# Altium footprint library SG__PCB_HOLE_Connector.PcbLib: 154 footprints (part 5 of 10)
Each footprint in its own frame and in the unit in brackets; x right, y up, seen from the top. Pads: shape width x height; smd on the part's side, far side on the other; paste and mask are expansions set on the pad; w line width, h text height; cw(c..) or ccw(c..) is an arc to the next point about the centre after c.
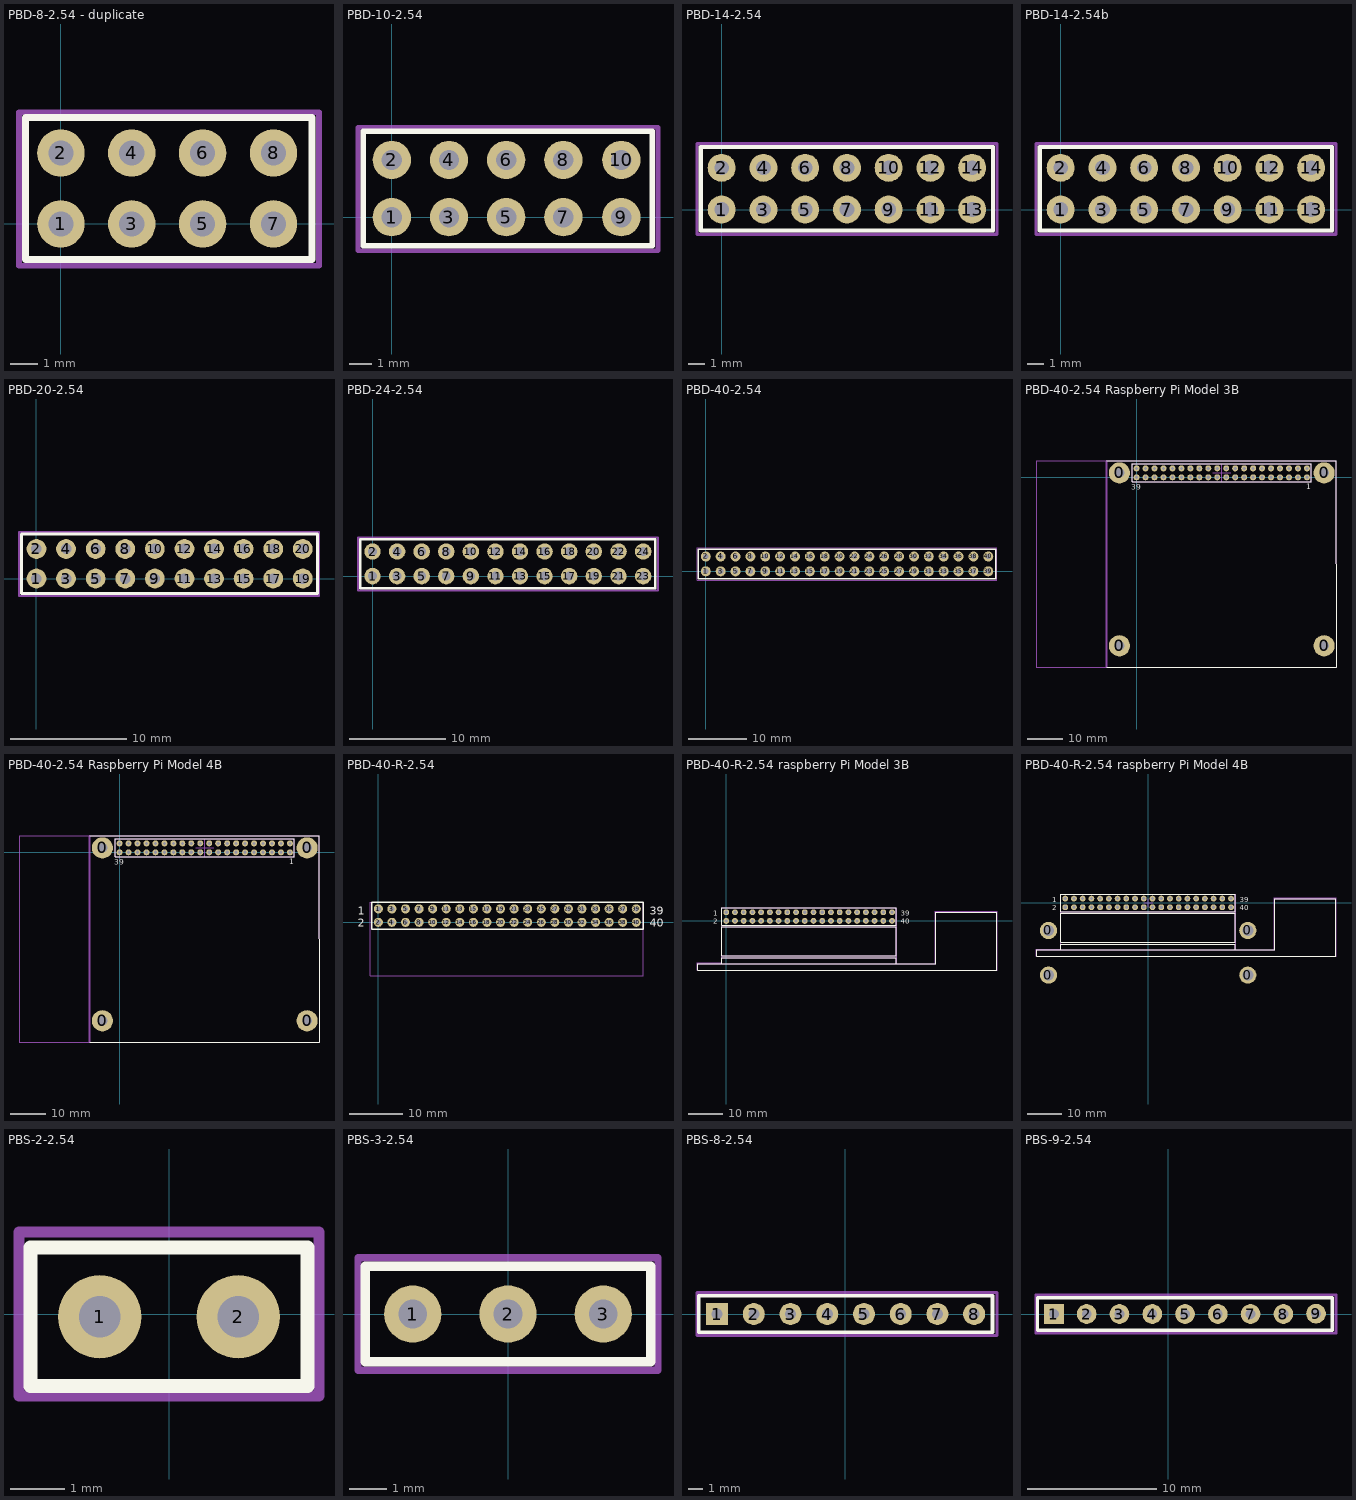
[diagram p4: the footprints below, top view; thin cyan lines are the x and y axes]

## PBD-8-2.54 - duplicate [mm]
pads (8):
  round 1.7 hole 0.9: 1(0,0) 2(0,2.54) 3(2.54,0) 4(2.54,2.54) 5(5.08,0) 6(5.08,2.54) 7(7.62,0) 8(7.62,2.54)
Top Overlay:
  lines w0.254: -1.27,-1.27 -1.27,3.81 9,3.81 9,-1.27 -1.27,-1.27
Top Courtyard:
  lines w0.2: -1.5,-1.5 -1.5,4 9.25,4 9.25,-1.5 -1.5,-1.5
3D body "PBS1-2.54.stp": height 9, standoff -2.65, extent 3.81,1.27 6.35,3.81
3D body "PBS1-2.54.stp": height 9, standoff -2.65, extent 3.81,-1.27 6.35,1.27
3D body "PBS1-2.54.stp": height 9, standoff -2.65, extent 6.35,-1.27 8.89,1.27
3D body "PBS1-2.54.stp": height 9, standoff -2.65, extent 6.35,1.27 8.89,3.81
3D body "PBS1-2.54.stp": height 9, standoff -2.65, extent 1.27,1.27 3.81,3.81
3D body "PBS1-2.54.stp": height 9, standoff -2.65, extent 1.27,-1.27 3.81,1.27
3D body "PBS1-2.54.stp": height 9, standoff -2.65, extent -1.27,-1.27 1.27,1.27
3D body "PBS1-2.54.stp": height 9, standoff -2.65, extent -1.27,1.27 1.27,3.81

## PBD-10-2.54 [mm]
pads (10):
  round 1.7 hole 0.9: 1(0,0) 2(0,2.54) 3(2.54,0) 4(2.54,2.54) 5(5.08,0) 6(5.08,2.54) 7(7.62,0) 8(7.62,2.54) 9(10.192,0) 10(10.192,2.54)
Top Overlay:
  lines w0.254: -1.27,-1.27 11.572,-1.27 11.572,3.81 -1.27,3.81 -1.27,-1.27
Top Courtyard:
  lines w0.2: -1.5,-1.5 11.822,-1.5 11.822,4 -1.5,4 -1.5,-1.5
3D body "PBS1-2.54.stp": height 9, standoff -2.65, extent 8.922,1.27 11.462,3.81
3D body "PBS1-2.54.stp": height 9, standoff -2.65, extent 8.922,-1.27 11.462,1.27
3D body "PBS1-2.54.stp": height 9, standoff -2.65, extent -1.27,1.27 1.27,3.81
3D body "PBS1-2.54.stp": height 9, standoff -2.65, extent -1.27,-1.27 1.27,1.27
3D body "PBS1-2.54.stp": height 9, standoff -2.65, extent 1.27,-1.27 3.81,1.27
3D body "PBS1-2.54.stp": height 9, standoff -2.65, extent 1.27,1.27 3.81,3.81
3D body "PBS1-2.54.stp": height 9, standoff -2.65, extent 6.35,1.27 8.89,3.81
3D body "PBS1-2.54.stp": height 9, standoff -2.65, extent 6.35,-1.27 8.89,1.27
3D body "PBS1-2.54.stp": height 9, standoff -2.65, extent 3.81,-1.27 6.35,1.27
3D body "PBS1-2.54.stp": height 9, standoff -2.65, extent 3.81,1.27 6.35,3.81

## PBD-14-2.54 [mm]
pads (14):
  round 1.7 hole 0.9: 1(0,0) 2(0,2.54) 3(2.54,0) 4(2.54,2.54) 5(5.08,0) 6(5.08,2.54) 7(7.62,0) 8(7.62,2.54) 9(10.16,0) 10(10.16,2.54) 11(12.7,0) 12(12.7,2.54) 13(15.24,0) 14(15.24,2.54)
Top Overlay:
  lines w0.254: -1.27,-1.27 16.51,-1.27 16.51,3.81 -1.27,3.81 -1.27,-1.27
Top Courtyard:
  lines w0.2: -1.5,-1.5 16.75,-1.5 16.75,4 -1.5,4 -1.5,-1.5
3D body "PBS1-2.54.stp": height 9, standoff -2.65, extent -1.27,1.27 1.27,3.81
3D body "PBS1-2.54.stp": height 9, standoff -2.65, extent -1.27,-1.27 1.27,1.27
3D body "PBS1-2.54.stp": height 9, standoff -2.65, extent 1.27,-1.27 3.81,1.27
3D body "PBS1-2.54.stp": height 9, standoff -2.65, extent 1.27,1.27 3.81,3.81
3D body "PBS1-2.54.stp": height 9, standoff -2.65, extent 6.35,1.27 8.89,3.81
3D body "PBS1-2.54.stp": height 9, standoff -2.65, extent 6.35,-1.27 8.89,1.27
3D body "PBS1-2.54.stp": height 9, standoff -2.65, extent 3.81,-1.27 6.35,1.27
3D body "PBS1-2.54.stp": height 9, standoff -2.65, extent 3.81,1.27 6.35,3.81
3D body "PBS1-2.54.stp": height 9, standoff -2.65, extent 11.43,1.27 13.97,3.81
3D body "PBS1-2.54.stp": height 9, standoff -2.65, extent 11.43,-1.27 13.97,1.27
3D body "PBS1-2.54.stp": height 9, standoff -2.65, extent 8.89,-1.27 11.43,1.27
3D body "PBS1-2.54.stp": height 9, standoff -2.65, extent 8.89,1.27 11.43,3.81
3D body "PBS1-2.54.stp": height 9, standoff -2.65, extent 13.97,-1.27 16.51,1.27
3D body "PBS1-2.54.stp": height 9, standoff -2.65, extent 13.97,1.27 16.51,3.81

## PBD-14-2.54b [mm]
pads (14):
  round 1.7 hole 0.9: 1(0,0) 2(0,2.54) 3(2.54,0) 4(2.54,2.54) 5(5.08,0) 6(5.08,2.54) 7(7.62,0) 8(7.62,2.54) 9(10.16,0) 10(10.16,2.54) 11(12.7,0) 12(12.7,2.54) 13(15.24,0) 14(15.24,2.54)
Top Overlay:
  lines w0.254: -1.27,-1.27 -1.27,3.81 16.51,3.81 16.51,-1.27 -1.27,-1.27
Top Courtyard:
  lines w0.2: -1.5,-1.5 16.75,-1.5 16.75,4 -1.5,4 -1.5,-1.5
3D body "PBS1-2.54.stp": height 2.65, standoff -9, extent 13.97,1.27 16.51,3.81
3D body "PBS1-2.54.stp": height 2.65, standoff -9, extent 13.97,-1.27 16.51,1.27
3D body "PBS1-2.54.stp": height 2.65, standoff -9, extent 8.89,1.27 11.43,3.81
3D body "PBS1-2.54.stp": height 2.65, standoff -9, extent 8.89,-1.27 11.43,1.27
3D body "PBS1-2.54.stp": height 2.65, standoff -9, extent 11.43,-1.27 13.97,1.27
3D body "PBS1-2.54.stp": height 2.65, standoff -9, extent 11.43,1.27 13.97,3.81
3D body "PBS1-2.54.stp": height 2.65, standoff -9, extent 3.81,1.27 6.35,3.81
3D body "PBS1-2.54.stp": height 2.65, standoff -9, extent 3.81,-1.27 6.35,1.27
3D body "PBS1-2.54.stp": height 2.65, standoff -9, extent 6.35,-1.27 8.89,1.27
3D body "PBS1-2.54.stp": height 2.65, standoff -9, extent 6.35,1.27 8.89,3.81
3D body "PBS1-2.54.stp": height 2.65, standoff -9, extent 1.27,1.27 3.81,3.81
3D body "PBS1-2.54.stp": height 2.65, standoff -9, extent 1.27,-1.27 3.81,1.27
3D body "PBS1-2.54.stp": height 2.65, standoff -9, extent -1.27,-1.27 1.27,1.27
3D body "PBS1-2.54.stp": height 2.65, standoff -9, extent -1.27,1.27 1.27,3.81

## PBD-20-2.54 [mm]
pads (20):
  round 1.7 hole 0.9: 1(0,0) 2(0,2.54) 3(2.54,0) 4(2.54,2.54) 5(5.08,0) 6(5.08,2.54) 7(7.62,0) 8(7.62,2.54) 9(10.16,0) 10(10.16,2.54) 11(12.7,0) 12(12.7,2.54) 13(15.24,0) 14(15.24,2.54) 15(17.78,0) 16(17.78,2.54) 17(20.32,0) 18(20.32,2.54) 19(22.86,0) 20(22.86,2.54)
Top Overlay:
  lines w0.254: -1.27,-1.27 24.13,-1.27 24.13,3.81 -1.27,3.81 -1.27,-1.27
Top Courtyard:
  lines w0.2: -1.5,-1.5 -1.5,4 24.25,4 24.25,-1.5 -1.5,-1.5
3D body "PBS1-2.54.stp": height 9, standoff -2.65, extent -1.27,1.27 1.27,3.81
3D body "PBS1-2.54.stp": height 9, standoff -2.65, extent -1.27,-1.27 1.27,1.27
3D body "PBS1-2.54.stp": height 9, standoff -2.65, extent 1.27,-1.27 3.81,1.27
3D body "PBS1-2.54.stp": height 9, standoff -2.65, extent 1.27,1.27 3.81,3.81
3D body "PBS1-2.54.stp": height 9, standoff -2.65, extent 6.35,1.27 8.89,3.81
3D body "PBS1-2.54.stp": height 9, standoff -2.65, extent 6.35,-1.27 8.89,1.27
3D body "PBS1-2.54.stp": height 9, standoff -2.65, extent 3.81,-1.27 6.35,1.27
3D body "PBS1-2.54.stp": height 9, standoff -2.65, extent 3.81,1.27 6.35,3.81
3D body "PBS1-2.54.stp": height 9, standoff -2.65, extent 11.43,1.27 13.97,3.81
3D body "PBS1-2.54.stp": height 9, standoff -2.65, extent 11.43,-1.27 13.97,1.27
3D body "PBS1-2.54.stp": height 9, standoff -2.65, extent 8.89,-1.27 11.43,1.27
3D body "PBS1-2.54.stp": height 9, standoff -2.65, extent 8.89,1.27 11.43,3.81
3D body "PBS1-2.54.stp": height 9, standoff -2.65, extent 16.51,1.27 19.05,3.81
3D body "PBS1-2.54.stp": height 9, standoff -2.65, extent 16.51,-1.27 19.05,1.27
3D body "PBS1-2.54.stp": height 9, standoff -2.65, extent 13.97,-1.27 16.51,1.27
3D body "PBS1-2.54.stp": height 9, standoff -2.65, extent 13.97,1.27 16.51,3.81
3D body "PBS1-2.54.stp": height 9, standoff -2.65, extent 21.59,1.27 24.13,3.81
3D body "PBS1-2.54.stp": height 9, standoff -2.65, extent 21.59,-1.27 24.13,1.27
3D body "PBS1-2.54.stp": height 9, standoff -2.65, extent 19.05,-1.27 21.59,1.27
3D body "PBS1-2.54.stp": height 9, standoff -2.65, extent 19.05,1.27 21.59,3.81

## PBD-24-2.54 [mm]
pads (24):
  round 1.7 hole 0.9: 1(0,0) 2(0,2.54) 3(2.54,0) 4(2.54,2.54) 5(5.08,0) 6(5.08,2.54) 7(7.62,0) 8(7.62,2.54) 9(10.16,0) 10(10.16,2.54) 11(12.7,0) 12(12.7,2.54) 13(15.24,0) 14(15.24,2.54) 15(17.78,0) 16(17.78,2.54) 17(20.32,0) 18(20.32,2.54) 19(22.86,0) 20(22.86,2.54) 21(25.425,0) 22(25.425,2.54) 23(27.965,0) 24(27.965,2.54)
Top Overlay:
  lines w0.254: -1.27,-1.27 -1.27,3.81 29.235,3.81 29.235,-1.27 -1.27,-1.27
Top Courtyard:
  lines w0.2: -1.5,-1.5 29.5,-1.5 29.5,4 -1.5,4 -1.5,-1.5
3D body "PBS1-2.54.stp": height 9, standoff -2.65, extent 21.59,-1.27 24.13,1.27
3D body "PBS1-2.54.stp": height 9, standoff -2.65, extent 21.59,1.27 24.13,3.81
3D body "PBS1-2.54.stp": height 9, standoff -2.65, extent 13.97,1.27 16.51,3.81
3D body "PBS1-2.54.stp": height 9, standoff -2.65, extent 13.97,-1.27 16.51,1.27
3D body "PBS1-2.54.stp": height 9, standoff -2.65, extent 16.51,-1.27 19.05,1.27
3D body "PBS1-2.54.stp": height 9, standoff -2.65, extent 16.51,1.27 19.05,3.81
3D body "PBS1-2.54.stp": height 9, standoff -2.65, extent 8.89,1.27 11.43,3.81
3D body "PBS1-2.54.stp": height 9, standoff -2.65, extent 8.89,-1.27 11.43,1.27
3D body "PBS1-2.54.stp": height 9, standoff -2.65, extent 11.43,-1.27 13.97,1.27
3D body "PBS1-2.54.stp": height 9, standoff -2.65, extent 11.43,1.27 13.97,3.81
3D body "PBS1-2.54.stp": height 9, standoff -2.65, extent 3.81,1.27 6.35,3.81
3D body "PBS1-2.54.stp": height 9, standoff -2.65, extent 3.81,-1.27 6.35,1.27
3D body "PBS1-2.54.stp": height 9, standoff -2.65, extent 6.35,-1.27 8.89,1.27
3D body "PBS1-2.54.stp": height 9, standoff -2.65, extent 6.35,1.27 8.89,3.81
3D body "PBS1-2.54.stp": height 9, standoff -2.65, extent 1.27,1.27 3.81,3.81
3D body "PBS1-2.54.stp": height 9, standoff -2.65, extent 1.27,-1.27 3.81,1.27
3D body "PBS1-2.54.stp": height 9, standoff -2.65, extent -1.27,-1.27 1.27,1.27
3D body "PBS1-2.54.stp": height 9, standoff -2.65, extent -1.27,1.27 1.27,3.81
3D body "PBS1-2.54.stp": height 9, standoff -2.65, extent 26.67,1.27 29.21,3.81
3D body "PBS1-2.54.stp": height 9, standoff -2.65, extent 26.67,-1.27 29.21,1.27
3D body "PBS1-2.54.stp": height 9, standoff -2.65, extent 24.13,-1.27 26.67,1.27
3D body "PBS1-2.54.stp": height 9, standoff -2.65, extent 24.13,1.27 26.67,3.81
3D body "PBS1-2.54.stp": height 9, standoff -2.65, extent 19.05,1.27 21.59,3.81
3D body "PBS1-2.54.stp": height 9, standoff -2.65, extent 19.05,-1.27 21.59,1.27

## PBD-40-2.54 [mm]
pads (40):
  round 1.7 hole 0.9: 1(0,0) 2(0,2.54) 3(2.54,0) 4(2.54,2.54) 5(5.08,0) 6(5.08,2.54) 7(7.62,0) 8(7.62,2.54) 9(10.16,0) 10(10.16,2.54) 11(12.7,0) 12(12.7,2.54) 13(15.24,0) 14(15.24,2.54) 15(17.78,0) 16(17.78,2.54) 17(20.32,0) 18(20.32,2.54) 19(22.86,0) 20(22.86,2.54) 21(25.4,0) 22(25.4,2.54) 23(27.94,0) 24(27.94,2.54) 25(30.48,0) 26(30.48,2.54) 27(33.02,0) 28(33.02,2.54) 29(35.56,0) 30(35.56,2.54) 31(38.1,0) 32(38.1,2.54) 33(40.64,0) 34(40.64,2.54) 35(43.18,0) 36(43.18,2.54) 37(45.72,0) 38(45.72,2.54) 39(48.26,0) 40(48.26,2.54)
Top Overlay:
  lines w0.254: -1.27,-1.27 -1.27,3.81 24.13,3.81 49.53,3.81 49.53,-1.27 24.13,-1.27 -1.27,-1.27
Top Courtyard:
  lines w0.2: -1.5,-1.5 49.75,-1.5 49.75,4 -1.5,4 -1.5,-1.5
3D body "PBS1-2.54.stp": height 9, standoff -2.65, extent 8.89,-1.27 11.43,1.27
3D body "PBS1-2.54.stp": height 9, standoff -2.65, extent 11.43,-1.27 13.97,1.27
3D body "PBS1-2.54.stp": height 9, standoff -2.65, extent 11.43,1.27 13.97,3.81
3D body "PBS1-2.54.stp": height 9, standoff -2.65, extent 3.81,1.27 6.35,3.81
3D body "PBS1-2.54.stp": height 9, standoff -2.65, extent 3.81,-1.27 6.35,1.27
3D body "PBS1-2.54.stp": height 9, standoff -2.65, extent 6.35,-1.27 8.89,1.27
3D body "PBS1-2.54.stp": height 9, standoff -2.65, extent 6.35,1.27 8.89,3.81
3D body "PBS1-2.54.stp": height 9, standoff -2.65, extent 1.27,1.27 3.81,3.81
3D body "PBS1-2.54.stp": height 9, standoff -2.65, extent 1.27,-1.27 3.81,1.27
3D body "PBS1-2.54.stp": height 9, standoff -2.65, extent -1.27,-1.27 1.27,1.27
3D body "PBS1-2.54.stp": height 9, standoff -2.65, extent -1.27,1.27 1.27,3.81
3D body "PBS1-2.54.stp": height 9, standoff -2.65, extent 24.13,1.27 26.67,3.81
3D body "PBS1-2.54.stp": height 9, standoff -2.65, extent 24.13,-1.27 26.67,1.27
3D body "PBS1-2.54.stp": height 9, standoff -2.65, extent 26.67,-1.27 29.21,1.27
3D body "PBS1-2.54.stp": height 9, standoff -2.65, extent 26.67,1.27 29.21,3.81
3D body "PBS1-2.54.stp": height 9, standoff -2.65, extent 31.75,1.27 34.29,3.81
3D body "PBS1-2.54.stp": height 9, standoff -2.65, extent 31.75,-1.27 34.29,1.27
3D body "PBS1-2.54.stp": height 9, standoff -2.65, extent 29.21,-1.27 31.75,1.27
3D body "PBS1-2.54.stp": height 9, standoff -2.65, extent 29.21,1.27 31.75,3.81
3D body "PBS1-2.54.stp": height 9, standoff -2.65, extent 36.83,1.27 39.37,3.81
3D body "PBS1-2.54.stp": height 9, standoff -2.65, extent 36.83,-1.27 39.37,1.27
3D body "PBS1-2.54.stp": height 9, standoff -2.65, extent 34.29,-1.27 36.83,1.27
3D body "PBS1-2.54.stp": height 9, standoff -2.65, extent 34.29,1.27 36.83,3.81
3D body "PBS1-2.54.stp": height 9, standoff -2.65, extent 41.91,1.27 44.45,3.81
3D body "PBS1-2.54.stp": height 9, standoff -2.65, extent 41.91,-1.27 44.45,1.27
3D body "PBS1-2.54.stp": height 9, standoff -2.65, extent 39.37,-1.27 41.91,1.27
3D body "PBS1-2.54.stp": height 9, standoff -2.65, extent 39.37,1.27 41.91,3.81
3D body "PBS1-2.54.stp": height 9, standoff -2.65, extent 46.99,1.27 49.53,3.81
3D body "PBS1-2.54.stp": height 9, standoff -2.65, extent 46.99,-1.27 49.53,1.27
3D body "PBS1-2.54.stp": height 9, standoff -2.65, extent 44.45,-1.27 46.99,1.27
3D body "PBS1-2.54.stp": height 9, standoff -2.65, extent 44.45,1.27 46.99,3.81
3D body "PBS1-2.54.stp": height 9, standoff -2.65, extent 19.05,1.27 21.59,3.81
3D body "PBS1-2.54.stp": height 9, standoff -2.65, extent 19.05,-1.27 21.59,1.27
3D body "PBS1-2.54.stp": height 9, standoff -2.65, extent 21.59,-1.27 24.13,1.27
3D body "PBS1-2.54.stp": height 9, standoff -2.65, extent 21.59,1.27 24.13,3.81
3D body "PBS1-2.54.stp": height 9, standoff -2.65, extent 13.97,1.27 16.51,3.81
3D body "PBS1-2.54.stp": height 9, standoff -2.65, extent 13.97,-1.27 16.51,1.27
3D body "PBS1-2.54.stp": height 9, standoff -2.65, extent 16.51,-1.27 19.05,1.27
3D body "PBS1-2.54.stp": height 9, standoff -2.65, extent 16.51,1.27 19.05,3.81
3D body "PBS1-2.54.stp": height 9, standoff -2.65, extent 8.89,1.27 11.43,3.81

## PBD-40-2.54 Raspberry Pi Model 3B [mm]
pads (44):
  round 6 hole 2.75: 0(-4.87,-47.73) 0(-4.87,1.27) 0(53.13,-47.73) 0(53.13,1.27)
  round 1.7 hole 0.9: 1(48.26,0) 2(48.26,2.54) 3(45.72,0) 4(45.72,2.54) 5(43.18,0) 6(43.18,2.54) 7(40.64,0) 8(40.64,2.54) 9(38.1,0) 10(38.1,2.54) 11(35.56,0) 12(35.56,2.54) 13(33.02,0) 14(33.02,2.54) 15(30.48,0) 16(30.48,2.54) 17(27.94,0) 18(27.94,2.54) 19(25.4,0) 20(25.4,2.54) 21(22.86,0) 22(22.86,2.54) 23(20.32,0) 24(20.32,2.54) 25(17.78,0) 26(17.78,2.54) 27(15.24,0) 28(15.24,2.54) 29(12.7,0) 30(12.7,2.54) 31(10.16,0) 32(10.16,2.54) 33(7.62,0) 34(7.62,2.54) 35(5.08,0) 36(5.08,2.54) 37(2.54,0) 38(2.54,2.54) 39(0,0) 40(0,2.54)
Top Overlay:
  lines w0.2: -8.5,-53.8 56.5,-53.8 56.5,4.7 -8.5,4.7
  lines w0.254: -1.27,-1.27 24.13,-1.27 49.53,-1.27 49.53,3.81 24.13,3.81 -1.27,3.81 -1.27,-1.27
  text "39" at -1.476,-3.503 h1.52
  text "1" at 48.057,-3.428 h1.52
Top Assembly:
  lines w0.2: -28.5,-53.8 56.5,-53.8 56.5,4.7 -28.5,4.7 -28.5,-53.766
  lines w0.254: -1.27,-1.27 -1.27,3.81 24.13,3.81 49.53,3.81 49.53,-1.27 24.13,-1.27 -1.27,-1.27
Dimensions:
  lines w0.2: 21.59,1.27 26.67,1.27 ; 24.13,-1.27 24.13,3.81
  lines w0.5: -8.5,-53.8 -8.5,4.7
  text "Board edge" at -9.762,-32.246 h1.52
Top Courtyard:
  lines w0.2: -28.5,-53.811 -28.5,4.689 ; -28.5,-53.8 56.5,-53.8 56.5,4.7 -28.5,4.7
3D body "raspberryPi3BSimplified_STEP.STEP": height 15, standoff -3.55, extent -30.3,-53.8 56.7,4.7
3D body "PBS1-2.54.stp": height 9, standoff -2.65, extent 8.89,1.27 11.43,3.81
3D body "PBS1-2.54.stp": height 9, standoff -2.65, extent -1.27,-1.27 1.27,1.27
3D body "PBS1-2.54.stp": height 9, standoff -2.65, extent -1.27,1.27 1.27,3.81
3D body "PBS1-2.54.stp": height 9, standoff -2.65, extent 3.81,1.27 6.35,3.81
3D body "PBS1-2.54.stp": height 9, standoff -2.65, extent 3.81,-1.27 6.35,1.27
3D body "PBS1-2.54.stp": height 9, standoff -2.65, extent 6.35,-1.27 8.89,1.27
3D body "PBS1-2.54.stp": height 9, standoff -2.65, extent 6.35,1.27 8.89,3.81
3D body "PBS1-2.54.stp": height 9, standoff -2.65, extent 1.27,1.27 3.81,3.81
3D body "PBS1-2.54.stp": height 9, standoff -2.65, extent 1.27,-1.27 3.81,1.27
3D body "PBS1-2.54.stp": height 9, standoff -2.65, extent 8.89,-1.27 11.43,1.27
3D body "PBS1-2.54.stp": height 9, standoff -2.65, extent 11.43,-1.27 13.97,1.27
3D body "PBS1-2.54.stp": height 9, standoff -2.65, extent 11.43,1.27 13.97,3.81
3D body "PBS1-2.54.stp": height 9, standoff -2.65, extent 13.97,1.27 16.51,3.81
3D body "PBS1-2.54.stp": height 9, standoff -2.65, extent 13.97,-1.27 16.51,1.27
3D body "PBS1-2.54.stp": height 9, standoff -2.65, extent 16.51,-1.27 19.05,1.27
3D body "PBS1-2.54.stp": height 9, standoff -2.65, extent 16.51,1.27 19.05,3.81
3D body "PBS1-2.54.stp": height 9, standoff -2.65, extent 19.05,1.27 21.59,3.81
3D body "PBS1-2.54.stp": height 9, standoff -2.65, extent 19.05,-1.27 21.59,1.27
3D body "PBS1-2.54.stp": height 9, standoff -2.65, extent 21.59,-1.27 24.13,1.27
3D body "PBS1-2.54.stp": height 9, standoff -2.65, extent 21.59,1.27 24.13,3.81
3D body "PBS1-2.54.stp": height 9, standoff -2.65, extent 24.13,1.27 26.67,3.81
3D body "PBS1-2.54.stp": height 9, standoff -2.65, extent 24.13,-1.27 26.67,1.27
3D body "PBS1-2.54.stp": height 9, standoff -2.65, extent 26.67,-1.27 29.21,1.27
3D body "PBS1-2.54.stp": height 9, standoff -2.65, extent 26.67,1.27 29.21,3.81
3D body "PBS1-2.54.stp": height 9, standoff -2.65, extent 29.21,1.27 31.75,3.81
3D body "PBS1-2.54.stp": height 9, standoff -2.65, extent 29.21,-1.27 31.75,1.27
3D body "PBS1-2.54.stp": height 9, standoff -2.65, extent 31.75,1.27 34.29,3.81
3D body "PBS1-2.54.stp": height 9, standoff -2.65, extent 31.75,-1.27 34.29,1.27
3D body "PBS1-2.54.stp": height 9, standoff -2.65, extent 34.29,1.27 36.83,3.81
3D body "PBS1-2.54.stp": height 9, standoff -2.65, extent 34.29,-1.27 36.83,1.27
3D body "PBS1-2.54.stp": height 9, standoff -2.65, extent 36.83,1.27 39.37,3.81
3D body "PBS1-2.54.stp": height 9, standoff -2.65, extent 36.83,-1.27 39.37,1.27
3D body "PBS1-2.54.stp": height 9, standoff -2.65, extent 39.37,1.27 41.91,3.81
3D body "PBS1-2.54.stp": height 9, standoff -2.65, extent 39.37,-1.27 41.91,1.27
3D body "PBS1-2.54.stp": height 9, standoff -2.65, extent 41.91,1.27 44.45,3.81
3D body "PBS1-2.54.stp": height 9, standoff -2.65, extent 41.91,-1.27 44.45,1.27
3D body "PBS1-2.54.stp": height 9, standoff -2.65, extent 44.45,1.27 46.99,3.81
3D body "PBS1-2.54.stp": height 9, standoff -2.65, extent 44.45,-1.27 46.99,1.27
3D body "PBS1-2.54.stp": height 9, standoff -2.65, extent 46.99,1.27 49.53,3.81
3D body "PBS1-2.54.stp": height 9, standoff -2.65, extent 46.99,-1.27 49.53,1.27

## PBD-40-2.54 Raspberry Pi Model 4B [mm]
pads (44):
  round 6 hole 2.75: 0(-4.87,-47.73) 0(-4.87,1.27) 0(53.13,-47.73) 0(53.13,1.27)
  round 1.7 hole 0.9: 1(48.26,0) 2(48.26,2.54) 3(45.72,0) 4(45.72,2.54) 5(43.18,0) 6(43.18,2.54) 7(40.64,0) 8(40.64,2.54) 9(38.1,0) 10(38.1,2.54) 11(35.56,0) 12(35.56,2.54) 13(33.02,0) 14(33.02,2.54) 15(30.48,0) 16(30.48,2.54) 17(27.94,0) 18(27.94,2.54) 19(25.4,0) 20(25.4,2.54) 21(22.86,0) 22(22.86,2.54) 23(20.32,0) 24(20.32,2.54) 25(17.78,0) 26(17.78,2.54) 27(15.24,0) 28(15.24,2.54) 29(12.7,0) 30(12.7,2.54) 31(10.16,0) 32(10.16,2.54) 33(7.62,0) 34(7.62,2.54) 35(5.08,0) 36(5.08,2.54) 37(2.54,0) 38(2.54,2.54) 39(0,0) 40(0,2.54)
Top Overlay:
  lines w0.2: -8.5,-53.8 56.5,-53.8 56.5,4.7 -8.5,4.7
  lines w0.254: -1.27,-1.27 24.13,-1.27 49.53,-1.27 49.53,3.81 24.13,3.81 -1.27,3.81 -1.27,-1.27
  text "39" at -1.476,-3.503 h1.52
  text "1" at 48.057,-3.428 h1.52
Top Assembly:
  lines w0.2: -28.5,-53.8 56.5,-53.8 56.5,4.7 -28.5,4.7 -28.5,-53.766
  lines w0.254: -1.27,-1.27 -1.27,3.81 24.13,3.81 49.53,3.81 49.53,-1.27 24.13,-1.27 -1.27,-1.27
Dimensions:
  lines w0.2: 21.59,1.27 26.67,1.27 ; 24.13,-1.27 24.13,3.81
  lines w0.5: -8.5,-53.8 -8.5,4.7
  text "Board edge" at -9.762,-32.246 h1.52
Top Courtyard:
  lines w0.2: -28.5,-53.811 -28.5,4.689 ; -28.5,-53.8 56.5,-53.8 56.5,4.7 -28.5,4.7
3D body "PBS1-2.54.stp": height 9, standoff -2.65, extent 8.89,1.27 11.43,3.81
3D body "PBS1-2.54.stp": height 9, standoff -2.65, extent -1.27,-1.27 1.27,1.27
3D body "PBS1-2.54.stp": height 9, standoff -2.65, extent -1.27,1.27 1.27,3.81
3D body "PBS1-2.54.stp": height 9, standoff -2.65, extent 3.81,1.27 6.35,3.81
3D body "PBS1-2.54.stp": height 9, standoff -2.65, extent 3.81,-1.27 6.35,1.27
3D body "PBS1-2.54.stp": height 9, standoff -2.65, extent 6.35,-1.27 8.89,1.27
3D body "PBS1-2.54.stp": height 9, standoff -2.65, extent 6.35,1.27 8.89,3.81
3D body "PBS1-2.54.stp": height 9, standoff -2.65, extent 1.27,1.27 3.81,3.81
3D body "PBS1-2.54.stp": height 9, standoff -2.65, extent 1.27,-1.27 3.81,1.27
3D body "PBS1-2.54.stp": height 9, standoff -2.65, extent 8.89,-1.27 11.43,1.27
3D body "PBS1-2.54.stp": height 9, standoff -2.65, extent 11.43,-1.27 13.97,1.27
3D body "PBS1-2.54.stp": height 9, standoff -2.65, extent 11.43,1.27 13.97,3.81
3D body "PBS1-2.54.stp": height 9, standoff -2.65, extent 13.97,1.27 16.51,3.81
3D body "PBS1-2.54.stp": height 9, standoff -2.65, extent 13.97,-1.27 16.51,1.27
3D body "PBS1-2.54.stp": height 9, standoff -2.65, extent 16.51,-1.27 19.05,1.27
3D body "PBS1-2.54.stp": height 9, standoff -2.65, extent 16.51,1.27 19.05,3.81
3D body "PBS1-2.54.stp": height 9, standoff -2.65, extent 19.05,1.27 21.59,3.81
3D body "PBS1-2.54.stp": height 9, standoff -2.65, extent 19.05,-1.27 21.59,1.27
3D body "PBS1-2.54.stp": height 9, standoff -2.65, extent 21.59,-1.27 24.13,1.27
3D body "PBS1-2.54.stp": height 9, standoff -2.65, extent 21.59,1.27 24.13,3.81
3D body "PBS1-2.54.stp": height 9, standoff -2.65, extent 24.13,1.27 26.67,3.81
3D body "PBS1-2.54.stp": height 9, standoff -2.65, extent 24.13,-1.27 26.67,1.27
3D body "PBS1-2.54.stp": height 9, standoff -2.65, extent 26.67,-1.27 29.21,1.27
3D body "PBS1-2.54.stp": height 9, standoff -2.65, extent 26.67,1.27 29.21,3.81
3D body "PBS1-2.54.stp": height 9, standoff -2.65, extent 29.21,1.27 31.75,3.81
3D body "PBS1-2.54.stp": height 9, standoff -2.65, extent 29.21,-1.27 31.75,1.27
3D body "PBS1-2.54.stp": height 9, standoff -2.65, extent 31.75,1.27 34.29,3.81
3D body "PBS1-2.54.stp": height 9, standoff -2.65, extent 31.75,-1.27 34.29,1.27
3D body "PBS1-2.54.stp": height 9, standoff -2.65, extent 34.29,1.27 36.83,3.81
3D body "PBS1-2.54.stp": height 9, standoff -2.65, extent 34.29,-1.27 36.83,1.27
3D body "PBS1-2.54.stp": height 9, standoff -2.65, extent 36.83,1.27 39.37,3.81
3D body "PBS1-2.54.stp": height 9, standoff -2.65, extent 36.83,-1.27 39.37,1.27
3D body "PBS1-2.54.stp": height 9, standoff -2.65, extent 39.37,1.27 41.91,3.81
3D body "PBS1-2.54.stp": height 9, standoff -2.65, extent 39.37,-1.27 41.91,1.27
3D body "PBS1-2.54.stp": height 9, standoff -2.65, extent 41.91,1.27 44.45,3.81
3D body "PBS1-2.54.stp": height 9, standoff -2.65, extent 41.91,-1.27 44.45,1.27
3D body "PBS1-2.54.stp": height 9, standoff -2.65, extent 44.45,1.27 46.99,3.81
3D body "PBS1-2.54.stp": height 9, standoff -2.65, extent 44.45,-1.27 46.99,1.27
3D body "PBS1-2.54.stp": height 9, standoff -2.65, extent 46.99,1.27 49.53,3.81
3D body "PBS1-2.54.stp": height 9, standoff -2.65, extent 46.99,-1.27 49.53,1.27
3D body "Raspberry Pi 4 Model B.STEP": height 15.4, standoff -4.5, extent -32.09,-53.6 56.9,4.8

## PBD-40-R-2.54 [mm]
pads (40):
  round 1.7 hole 0.9: 1(0,2.54) 2(0,0.031) 3(2.54,2.54) 4(2.54,0.031) 5(5.08,2.54) 6(5.08,0.031) 7(7.62,2.54) 8(7.62,0.031) 9(10.16,2.54) 10(10.16,0.031) 11(12.7,2.54) 12(12.7,0.031) 13(15.24,2.54) 14(15.24,0.031) 15(17.78,2.54) 16(17.78,0.031) 17(20.32,2.54) 18(20.32,0.031) 19(22.86,2.54) 20(22.86,0.031) 21(25.4,2.54) 22(25.4,0.031) 23(27.94,2.54) 24(27.94,0.031) 25(30.48,2.54) 26(30.48,0.031) 27(33.02,2.54) 28(33.02,0.031) 29(35.56,2.54) 30(35.56,0.031) 31(38.1,2.54) 32(38.1,0.031) 33(40.64,2.54) 34(40.64,0.031) 35(43.18,2.54) 36(43.18,0.031) 37(45.72,2.54) 38(45.72,0.031) 39(48.26,2.54) 40(48.26,0.031)
Top Overlay:
  lines w0.254: -1.27,-1.27 -1.27,3.81 24.13,3.81 49.53,3.81 49.53,-1.27 24.13,-1.27 -1.27,-1.27
  text "1 / 2" at -3.81,-0.819 h1.52
  text "39 / 40" at 50.8,-0.819 h1.52
Top Courtyard:
  lines w0.2: -1.377,3.81 49.53,3.81 49.53,-10 -1.5,-10 -1.5,3.81 -1.254,3.81
3D body "PBD-4R.step": height 5, standoff -3, extent 44.437,-10.129 49.517,2.871
3D body "PBD-4R.step": height 5, standoff -3, extent 39.357,-10.129 44.437,2.871
3D body "PBD-4R.step": height 5, standoff -3, extent 34.277,-10.129 39.357,2.871
3D body "PBD-4R.step": height 5, standoff -3, extent 29.197,-10.129 34.277,2.871
3D body "PBD-4R.step": height 5, standoff -3, extent 24.117,-10.129 29.197,2.871
3D body "PBD-4R.step": height 5, standoff -3, extent 19.037,-10.129 24.117,2.871
3D body "PBD-4R.step": height 5, standoff -3, extent 13.957,-10.129 19.037,2.871
3D body "PBD-4R.step": height 5, standoff -3, extent 8.877,-10.129 13.957,2.871
3D body "PBD-4R.step": height 5, standoff -3, extent 3.797,-10.129 8.877,2.871
3D body "PBD-4R.step": height 5, standoff -3, extent -1.283,-10.129 3.797,2.871

## PBD-40-R-2.54 raspberry Pi Model 3B [mm]
pads (40):
  round 1.7 hole 0.9: 1(0,2.54) 2(0,0.031) 3(2.54,2.54) 4(2.54,0.031) 5(5.08,2.54) 6(5.08,0.031) 7(7.62,2.54) 8(7.62,0.031) 9(10.16,2.54) 10(10.16,0.031) 11(12.7,2.54) 12(12.7,0.031) 13(15.24,2.54) 14(15.24,0.031) 15(17.78,2.54) 16(17.78,0.031) 17(20.32,2.54) 18(20.32,0.031) 19(22.86,2.54) 20(22.86,0.031) 21(25.4,2.54) 22(25.4,0.031) 23(27.94,2.54) 24(27.94,0.031) 25(30.48,2.54) 26(30.48,0.031) 27(33.02,2.54) 28(33.02,0.031) 29(35.56,2.54) 30(35.56,0.031) 31(38.1,2.54) 32(38.1,0.031) 33(40.64,2.54) 34(40.64,0.031) 35(43.18,2.54) 36(43.18,0.031) 37(45.72,2.54) 38(45.72,0.031) 39(48.26,2.54) 40(48.26,0.031)
Top Overlay:
  lines w0.2: -1.3,-12.4 -1.3,-10.7 49.517,-10.7 49.517,-12.4 ; -1.3,-1.7 -1.283,-1.7 ; -1.283,-1.7 -1.283,-10.129 49.5,-10.129 49.5,-1.7 -1.283,-1.7 ; -8.3,-14.3 -8.3,-12.4 61,-12.4 61,2.54 78.7,2.54 78.7,-14.3 -8.3,-14.3
  lines w0.254: -1.27,-1.27 -1.27,3.81 24.13,3.81 49.53,3.81 49.53,-1.27 24.13,-1.27 -1.27,-1.27
  text "1 / 2" at -3.81,-0.819 h1.52
  text "39 / 40" at 50.8,-0.819 h1.52
Top Assembly:
  lines w0.2: -1.3,-12.4 -1.3,-10.7 49.517,-10.7 49.517,-12.4 ; -1.3,-1.7 -1.283,-1.7 ; -1.283,-1.7 -1.283,-10.129 49.5,-10.129 49.5,-1.7 -1.283,-1.7 ; -8.3,-14.3 -8.3,-12.4 61,-12.4 61,2.54 78.7,2.54 78.7,-14.3 -8.3,-14.3
  lines w0.254: -1.27,-1.27 -1.27,3.81 24.13,3.81 49.53,3.81 49.53,-1.27 24.13,-1.27 -1.27,-1.27
Top Courtyard:
  lines w0.2: -1.27,3.81 -1.3,3.81 ; -1.3,3.81 -1.3,-12.2 -8.5,-12.2 -8.5,-14.3 78.8,-14.3 78.8,2.8 60.764,2.8 60.764,-12.4 49.6,-12.4 49.6,3.81 -1.3,3.81
3D body "PBD-4R.step": height 6, standoff -2, extent 3.797,-10.129 8.877,2.871
3D body "PBD-4R.step": height 6, standoff -2, extent 44.437,-10.129 49.517,2.871
3D body "PBD-4R.step": height 6, standoff -2, extent 39.357,-10.129 44.437,2.871
3D body "PBD-4R.step": height 6, standoff -2, extent 34.277,-10.129 39.357,2.871
3D body "PBD-4R.step": height 6, standoff -2, extent 29.197,-10.129 34.277,2.871
3D body "PBD-4R.step": height 6, standoff -2, extent 24.117,-10.129 29.197,2.871
3D body "PBD-4R.step": height 6, standoff -2, extent 19.037,-10.129 24.117,2.871
3D body "PBD-4R.step": height 6, standoff -2, extent 13.957,-10.129 19.037,2.871
3D body "PBD-4R.step": height 6, standoff -2, extent 8.877,-10.129 13.957,2.871
3D body "PBD-4R.step": height 6, standoff -2, extent -1.283,-10.129 3.797,2.871
3D body "raspberryPi3BSimplified_STEP.STEP": height 58.5, standoff 0, extent -8.3,-16 78.7,2.55

## PBD-40-R-2.54 raspberry Pi Model 4B [mm]
pads (44):
  round 5 hole 3.2: 0(-29,-21) 0(-29,-8) 0(29,-21) 0(29,-8)
  round 1.7 hole 0.9: 1(-24.13,1.27) 2(-24.13,-1.239) 3(-21.59,1.27) 4(-21.59,-1.239) 5(-19.05,1.27) 6(-19.05,-1.239) 7(-16.51,1.27) 8(-16.51,-1.239) 9(-13.97,1.27) 10(-13.97,-1.239) 11(-11.43,1.27) 12(-11.43,-1.239) 13(-8.89,1.27) 14(-8.89,-1.239) 15(-6.35,1.27) 16(-6.35,-1.239) 17(-3.81,1.27) 18(-3.81,-1.239) 19(-1.27,1.27) 20(-1.27,-1.239) 21(1.27,1.27) 22(1.27,-1.239) 23(3.81,1.27) 24(3.81,-1.239) 25(6.35,1.27) 26(6.35,-1.239) 27(8.89,1.27) 28(8.89,-1.239) 29(11.43,1.27) 30(11.43,-1.239) 31(13.97,1.27) 32(13.97,-1.239) 33(16.51,1.27) 34(16.51,-1.239) 35(19.05,1.27) 36(19.05,-1.239) 37(21.59,1.27) 38(21.59,-1.239) 39(24.13,1.27) 40(24.13,-1.239)
Top Overlay:
  lines w0.2: -25.43,-13.67 -25.43,-11.97 25.387,-11.97 25.387,-13.67 ; -25.43,-2.97 -25.413,-2.97 ; -25.413,-2.97 25.37,-2.97 25.37,-11.399 -25.413,-11.399 -25.413,-2.97 ; -32.43,-15.57 54.57,-15.57 54.57,1.27 36.87,1.27 36.87,-13.67 -32.43,-13.67 -32.43,-15.57
  lines w0.254: -25.4,-2.54 0,-2.54 25.4,-2.54 25.4,2.54 0,2.54 -25.4,2.54 -25.4,-2.54
  text "39 / 40" at 26.67,-2.089 h1.52
  text "1 / 2" at -27.94,-2.089 h1.52
Top Assembly:
  lines w0.2: -25.43,-13.67 -25.43,-11.97 25.387,-11.97 25.387,-13.67 ; -25.43,-2.97 -25.413,-2.97 ; -25.413,-2.97 25.37,-2.97 25.37,-11.399 -25.413,-11.399 -25.413,-2.97 ; -32.43,-15.57 54.57,-15.57 54.57,1.27 36.87,1.27 36.87,-13.67 -32.43,-13.67 -32.43,-15.57
  lines w0.254: -25.4,-2.54 0,-2.54 25.4,-2.54 25.4,2.54 0,2.54 -25.4,2.54 -25.4,-2.54
Dimensions:
  lines w0.2: -1.257,0 1.283,0 ; 0,-1.239 0,1.27
Top Courtyard:
  lines w0.2: -25.4,2.54 -25.43,2.54 ; -25.43,2.54 25.47,2.54 25.47,-13.67 36.634,-13.67 36.634,1.53 54.67,1.53 54.67,-15.57 -32.63,-15.57 -32.63,-13.47 -25.43,-13.47 -25.43,2.54
3D body "Raspberry Pi 4 Model B.STEP": height 58.4, standoff 0, extent -32.464,-17.67 56.526,2.23
3D body "PBD-4R.step": height 6, standoff -2, extent -25.413,-11.399 -20.333,1.601
3D body "PBD-4R.step": height 6, standoff -2, extent -15.253,-11.399 -10.173,1.601
3D body "PBD-4R.step": height 6, standoff -2, extent -10.173,-11.399 -5.093,1.601
3D body "PBD-4R.step": height 6, standoff -2, extent -5.093,-11.399 -0.013,1.601
3D body "PBD-4R.step": height 6, standoff -2, extent -0.013,-11.399 5.067,1.601
3D body "PBD-4R.step": height 6, standoff -2, extent 5.067,-11.399 10.147,1.601
3D body "PBD-4R.step": height 6, standoff -2, extent 10.147,-11.399 15.227,1.601
3D body "PBD-4R.step": height 6, standoff -2, extent 15.227,-11.399 20.307,1.601
3D body "PBD-4R.step": height 6, standoff -2, extent 20.307,-11.399 25.387,1.601
3D body "PBD-4R.step": height 6, standoff -2, extent -20.333,-11.399 -15.253,1.601

## PBS-2-2.54 [mil]
pads (2):
  round 60 hole 30: 1(-50,-2) 2(50,-2)
Top Overlay:
  lines w10: -100,-52 -100,48 100,48 100,-52 -100,-52
Top Courtyard:
  lines w7.87: -108.27,-59.06 108.27,-59.06 108.27,59.06 -108.27,59.06 -108.27,-59.06
3D body "PBS1-2.54.stp": height 334.65, standoff -124.02, extent 0,-52 100,48
3D body "PBS1-2.54.stp": height 334.65, standoff -124.02, extent -100,-52 0,48

## PBS-3-2.54 [mil]
pads (3):
  round 60 hole 30: 1(-100,0) 2(0,0) 3(100,0)
Top Overlay:
  lines w10: -150,-50 -150,50 150,50 150,-50 -150,-50
Top Courtyard:
  lines w7.87: -157.48,-59.06 -157.48,59.06 157.48,59.06 157.48,-59.06 -157.48,-59.06
3D body "PBS1-2.54.stp": height 334.65, standoff -124.02, extent 50,-50 150,50
3D body "PBS1-2.54.stp": height 334.65, standoff -124.02, extent -50,-50 50,50
3D body "PBS1-2.54.stp": height 334.65, standoff -124.02, extent -150,-50 -50,50

## PBS-8-2.54 [mil]
pads (8):
  rect 60x60 hole 30: 1(-348.82,0)
  round 60 hole 30: 2(-248.82,0) 3(-148.82,0) 4(-48.82,0) 5(51.18,0) 6(151.18,0) 7(251.18,0) 8(351.18,0)
Top Overlay:
  lines w10: -3.15,-50 396.85,-50 ; -3.15,50 396.85,50 ; 1.18,-50 -398.82,-50 -398.82,50 1.18,50 ; 401.18,-50 401.18,50
Top Courtyard:
  lines w7.87: -403.54,-59.06 413.39,-59.06 413.39,59.06 -403.54,59.06 -403.54,-59.06
3D body "PBS1-2.54.stp": height 334.65, standoff -124.02, extent -198.82,-50 -98.82,50
3D body "PBS1-2.54.stp": height 334.65, standoff -124.02, extent -98.82,-50 1.18,50
3D body "PBS1-2.54.stp": height 334.65, standoff -124.02, extent 1.18,-50 101.18,50
3D body "PBS1-2.54.stp": height 334.65, standoff -124.02, extent 101.18,-50 201.18,50
3D body "PBS1-2.54.stp": height 334.65, standoff -124.02, extent 201.18,-50 301.18,50
3D body "PBS1-2.54.stp": height 334.65, standoff -124.02, extent 301.18,-50 401.18,50
3D body "PBS1-2.54.stp": height 334.65, standoff -124.02, extent -398.82,-50 -298.82,50
3D body "PBS1-2.54.stp": height 334.65, standoff -124.02, extent -298.82,-50 -198.82,50

## PBS-9-2.54 [mil]
pads (9):
  rect 60x60 hole 30: 1(-348.82,0)
  round 60 hole 30: 2(-248.82,0) 3(-148.82,0) 4(-48.82,0) 5(51.18,0) 6(151.18,0) 7(251.18,0) 8(351.18,0) 9(451,1)
Top Overlay:
  lines w10: -3.15,-50 500,-50 500,50 400,50 -3.15,50 ; 1.18,-50 -398.82,-50 -398.82,50 1.18,50
Top Courtyard:
  lines w7.87: -403.54,-59.06 -403.54,59.06 511.81,59.06 511.81,-59.06 -403.54,-59.06
3D body "PBS1-2.54.stp": height 334.65, standoff -124.02, extent 401,-49 501,51
3D body "PBS1-2.54.stp": height 334.65, standoff -124.02, extent 301.18,-50 401.18,50
3D body "PBS1-2.54.stp": height 334.65, standoff -124.02, extent 201.18,-50 301.18,50
3D body "PBS1-2.54.stp": height 334.65, standoff -124.02, extent 101.18,-50 201.18,50
3D body "PBS1-2.54.stp": height 334.65, standoff -124.02, extent 1.18,-50 101.18,50
3D body "PBS1-2.54.stp": height 334.65, standoff -124.02, extent -98.82,-50 1.18,50
3D body "PBS1-2.54.stp": height 334.65, standoff -124.02, extent -198.82,-50 -98.82,50
3D body "PBS1-2.54.stp": height 334.65, standoff -124.02, extent -298.82,-50 -198.82,50
3D body "PBS1-2.54.stp": height 334.65, standoff -124.02, extent -398.82,-50 -298.82,50